# Altium schematic symbol library jlcpcb_2025_04_capacitors_extended_0805.schlib: 3281 symbols (part 5 of 18) (continued)
## 08055A180JAT2A
designator C?  Capacitance: 18pF  (hidden comment: *)
Capacitor, Ceramic (MLCC), 18pF, ±5%, 50V, C0G, ±5%, SMD 0805; Manufacturer: AVX; Manufacturer Part Number: 08055A180JAT2A; Package Size: 0805; JLCPCB Basic Part: No; JLCPCB Part Number: C597363; Supplier 1: LCSC; Category: Capacitors - MLCC; Supplier Part Number 1: C597363; Tolerance: ±5%; Voltage Rating: 50V; Temperature Coefficient: C0G; RoHS: Yes; ComponentLink1Description: Datasheet; ComponentLink1URL: https://wmsc.lcsc.com/wmsc/upload/file/pdf/v2/lcsc/2304140030_Kyocera-AVX-08055A180JAT2A_C597363.pdf; ComponentLink2Description: JLCPCB Part URL; ComponentLink2URL: https://jlcpcb.com/partdetail/C597363; ComponentLink3Description: LCSC Part URL; ComponentLink3URL: https://lcsc.com/product-detail/Multilayer-Ceramic-Capacitors-MLCC---SMD-SMT_Kyocera-AVX-Kyocera-AVX-08055A180JAT2A_C597363.html
footprint CAP-0805 (0805 (2012M) Capacitor)
pins: 1, 2

## 08055A200JAT2A
designator C?  Capacitance: 20pF  (hidden comment: *)
Capacitor, Ceramic (MLCC), 20pF, ±5%, 50V, C0G, ±5%, SMD 0805; Manufacturer: Kyocera AVX; Manufacturer Part Number: 08055A200JAT2A; Package Size: 0805; JLCPCB Basic Part: No; JLCPCB Part Number: C2169473; Supplier 1: LCSC; Category: Capacitors - MLCC; Supplier Part Number 1: C2169473; Tolerance: ±5%; Voltage Rating: 50V; Temperature Coefficient: C0G; RoHS: Yes; ComponentLink1Description: Datasheet; ComponentLink1URL: https://wmsc.lcsc.com/wmsc/upload/file/pdf/v2/lcsc/2304140030_Kyocera-AVX-08055A200JAT2A_C2169473.pdf; ComponentLink2Description: JLCPCB Part URL; ComponentLink2URL: https://jlcpcb.com/partdetail/C2169473; ComponentLink3Description: LCSC Part URL; ComponentLink3URL: https://lcsc.com/product-detail/Multilayer-Ceramic-Capacitors-MLCC---SMD-SMT_Kyocera-AVX-Kyocera-AVX-08055A200JAT2A_C2169473.html
footprint CAP-0805 (0805 (2012M) Capacitor)
pins: 1, 2

## 08055A220JAT2A
designator C?  Capacitance: 22pF  (hidden comment: *)
Capacitor, Ceramic (MLCC), 22pF, ±5%, 50V, C0G, ±5%, SMD 0805; Manufacturer: Kyocera AVX; Manufacturer Part Number: 08055A220JAT2A; Package Size: 0805; JLCPCB Basic Part: No; JLCPCB Part Number: C2167083; Supplier 1: LCSC; Category: Capacitors - MLCC; Supplier Part Number 1: C2167083; Tolerance: ±5%; Voltage Rating: 50V; Temperature Coefficient: C0G; RoHS: Yes; ComponentLink1Description: Datasheet; ComponentLink1URL: https://wmsc.lcsc.com/wmsc/upload/file/pdf/v2/lcsc/2304140030_Kyocera-AVX-08055A220JAT2A_C2167083.pdf; ComponentLink2Description: JLCPCB Part URL; ComponentLink2URL: https://jlcpcb.com/partdetail/C2167083; ComponentLink3Description: LCSC Part URL; ComponentLink3URL: https://lcsc.com/product-detail/Multilayer-Ceramic-Capacitors-MLCC---SMD-SMT_Kyocera-AVX-Kyocera-AVX-08055A220JAT2A_C2167083.html
footprint CAP-0805 (0805 (2012M) Capacitor)
pins: 1, 2

## 08055A220KAT2A
designator C?  Capacitance: 22pF  (hidden comment: *)
Capacitor, Ceramic (MLCC), 22pF, ±10%, 50V, C0G, ±10%, SMD 0805; Manufacturer: AVX; Manufacturer Part Number: 08055A220KAT2A; Package Size: 0805; JLCPCB Basic Part: No; JLCPCB Part Number: C597366; Supplier 1: LCSC; Category: Capacitors - MLCC; Supplier Part Number 1: C597366; Tolerance: ±10%; Voltage Rating: 50V; Temperature Coefficient: C0G; RoHS: Yes; ComponentLink1Description: Datasheet; ComponentLink1URL: https://wmsc.lcsc.com/wmsc/upload/file/pdf/v2/lcsc/2304140030_Kyocera-AVX-08055A220KAT2A_C597366.pdf; ComponentLink2Description: JLCPCB Part URL; ComponentLink2URL: https://jlcpcb.com/partdetail/C597366; ComponentLink3Description: LCSC Part URL; ComponentLink3URL: https://lcsc.com/product-detail/Multilayer-Ceramic-Capacitors-MLCC---SMD-SMT_Kyocera-AVX-Kyocera-AVX-08055A220KAT2A_C597366.html
footprint CAP-0805 (0805 (2012M) Capacitor)
pins: 1, 2

## 08055A221JAT2A
designator C?  Capacitance: 220pF  (hidden comment: *)
Capacitor, Ceramic (MLCC), 220pF, ±5%, 50V, C0G, ±5%, SMD 0805; Manufacturer: Kyocera AVX; Manufacturer Part Number: 08055A221JAT2A; Package Size: 0805; JLCPCB Basic Part: No; JLCPCB Part Number: C2169096; Supplier 1: LCSC; Category: Capacitors - MLCC; Supplier Part Number 1: C2169096; Tolerance: ±5%; Voltage Rating: 50V; Temperature Coefficient: C0G; RoHS: Yes; ComponentLink1Description: Datasheet; ComponentLink1URL: https://wmsc.lcsc.com/wmsc/upload/file/pdf/v2/lcsc/2304140030_Kyocera-AVX-08055A221JAT2A_C2169096.pdf; ComponentLink2Description: JLCPCB Part URL; ComponentLink2URL: https://jlcpcb.com/partdetail/C2169096; ComponentLink3Description: LCSC Part URL; ComponentLink3URL: https://lcsc.com/product-detail/Multilayer-Ceramic-Capacitors-MLCC---SMD-SMT_Kyocera-AVX-Kyocera-AVX-08055A221JAT2A_C2169096.html
footprint CAP-0805 (0805 (2012M) Capacitor)
pins: 1, 2

## 08055A222JAT2A
designator C?  Capacitance: 2.2nF  (hidden comment: *)
Capacitor, Ceramic (MLCC), 2.2nF, ±5%, 50V, C0G, ±5%, SMD 0805; Manufacturer: AVX; Manufacturer Part Number: 08055A222JAT2A; Package Size: 0805; JLCPCB Basic Part: No; JLCPCB Part Number: C597368; Supplier 1: LCSC; Category: Capacitors - MLCC; Supplier Part Number 1: C597368; Tolerance: ±5%; Voltage Rating: 50V; Temperature Coefficient: C0G; RoHS: Yes; ComponentLink1Description: Datasheet; ComponentLink1URL: https://wmsc.lcsc.com/wmsc/upload/file/pdf/v2/lcsc/2304140030_Kyocera-AVX-08055A222JAT2A_C597368.pdf; ComponentLink2Description: JLCPCB Part URL; ComponentLink2URL: https://jlcpcb.com/partdetail/C597368; ComponentLink3Description: LCSC Part URL; ComponentLink3URL: https://lcsc.com/product-detail/Multilayer-Ceramic-Capacitors-MLCC---SMD-SMT_Kyocera-AVX-Kyocera-AVX-08055A222JAT2A_C597368.html
footprint CAP-0805 (0805 (2012M) Capacitor)
pins: 1, 2

## 08055A271JAT2A
designator C?  Capacitance: 270pF  (hidden comment: *)
Capacitor, Ceramic (MLCC), 270pF, ±5%, 50V, C0G, ±5%, SMD 0805; Manufacturer: Kyocera AVX; Manufacturer Part Number: 08055A271JAT2A; Package Size: 0805; JLCPCB Basic Part: No; JLCPCB Part Number: C2180917; Supplier 1: LCSC; Category: Capacitors - MLCC; Supplier Part Number 1: C2180917; Tolerance: ±5%; Voltage Rating: 50V; Temperature Coefficient: C0G; RoHS: Yes; ComponentLink1Description: Datasheet; ComponentLink1URL: https://wmsc.lcsc.com/wmsc/upload/file/pdf/v2/lcsc/2304140030_Kyocera-AVX-08055A271JAT2A_C2180917.pdf; ComponentLink2Description: JLCPCB Part URL; ComponentLink2URL: https://jlcpcb.com/partdetail/C2180917; ComponentLink3Description: LCSC Part URL; ComponentLink3URL: https://lcsc.com/product-detail/Multilayer-Ceramic-Capacitors-MLCC---SMD-SMT_Kyocera-AVX-Kyocera-AVX-08055A271JAT2A_C2180917.html
footprint CAP-0805 (0805 (2012M) Capacitor)
pins: 1, 2

## 08055A391JAT2A
designator C?  Capacitance: 390pF  (hidden comment: *)
Capacitor, Ceramic (MLCC), 390pF, ±5%, 50V, C0G, ±5%, SMD 0805; Manufacturer: Kyocera AVX; Manufacturer Part Number: 08055A391JAT2A; Package Size: 0805; JLCPCB Basic Part: No; JLCPCB Part Number: C2176641; Supplier 1: LCSC; Category: Capacitors - MLCC; Supplier Part Number 1: C2176641; Tolerance: ±5%; Voltage Rating: 50V; Temperature Coefficient: C0G; RoHS: Yes; ComponentLink1Description: Datasheet; ComponentLink1URL: https://wmsc.lcsc.com/wmsc/upload/file/pdf/v2/lcsc/2304140030_Kyocera-AVX-08055A391JAT2A_C2176641.pdf; ComponentLink2Description: JLCPCB Part URL; ComponentLink2URL: https://jlcpcb.com/partdetail/C2176641; ComponentLink3Description: LCSC Part URL; ComponentLink3URL: https://lcsc.com/product-detail/Multilayer-Ceramic-Capacitors-MLCC---SMD-SMT_Kyocera-AVX-Kyocera-AVX-08055A391JAT2A_C2176641.html
footprint CAP-0805 (0805 (2012M) Capacitor)
pins: 1, 2

## 08055A470JAT2A
designator C?  Capacitance: 47pF  (hidden comment: *)
Capacitor, Ceramic (MLCC), 47pF, ±5%, 50V, C0G, ±5%, SMD 0805; Manufacturer: AVX; Manufacturer Part Number: 08055A470JAT2A; Package Size: 0805; JLCPCB Basic Part: No; JLCPCB Part Number: C597375; Supplier 1: LCSC; Category: Capacitors - MLCC; Supplier Part Number 1: C597375; Tolerance: ±5%; Voltage Rating: 50V; Temperature Coefficient: C0G; RoHS: Yes; ComponentLink1Description: Datasheet; ComponentLink1URL: https://wmsc.lcsc.com/wmsc/upload/file/pdf/v2/lcsc/2304140030_Kyocera-AVX-08055A470JAT2A_C597375.pdf; ComponentLink2Description: JLCPCB Part URL; ComponentLink2URL: https://jlcpcb.com/partdetail/C597375; ComponentLink3Description: LCSC Part URL; ComponentLink3URL: https://lcsc.com/product-detail/Multilayer-Ceramic-Capacitors-MLCC---SMD-SMT_Kyocera-AVX-Kyocera-AVX-08055A470JAT2A_C597375.html
footprint CAP-0805 (0805 (2012M) Capacitor)
pins: 1, 2

## 08055A680JAT2A
designator C?  Capacitance: 68pF  (hidden comment: *)
Capacitor, Ceramic (MLCC), 68pF, ±5%, 50V, C0G, ±5%, SMD 0805; Manufacturer: AVX; Manufacturer Part Number: 08055A680JAT2A; Package Size: 0805; JLCPCB Basic Part: No; JLCPCB Part Number: C597382; Supplier 1: LCSC; Category: Capacitors - MLCC; Supplier Part Number 1: C597382; Tolerance: ±5%; Voltage Rating: 50V; Temperature Coefficient: C0G; RoHS: Yes; ComponentLink1Description: Datasheet; ComponentLink1URL: https://wmsc.lcsc.com/wmsc/upload/file/pdf/v2/lcsc/2304140030_Kyocera-AVX-08055A680JAT2A_C597382.pdf; ComponentLink2Description: JLCPCB Part URL; ComponentLink2URL: https://jlcpcb.com/partdetail/C597382; ComponentLink3Description: LCSC Part URL; ComponentLink3URL: https://lcsc.com/product-detail/Multilayer-Ceramic-Capacitors-MLCC---SMD-SMT_Kyocera-AVX-Kyocera-AVX-08055A680JAT2A_C597382.html
footprint CAP-0805 (0805 (2012M) Capacitor)
pins: 1, 2

## 08055A681JAT2A
designator C?  Capacitance: 680pF  (hidden comment: *)
Capacitor, Ceramic (MLCC), 680pF, ±5%, 50V, C0G, ±5%, SMD 0805; Manufacturer: AVX; Manufacturer Part Number: 08055A681JAT2A; Package Size: 0805; JLCPCB Basic Part: No; JLCPCB Part Number: C597383; Supplier 1: LCSC; Category: Capacitors - MLCC; Supplier Part Number 1: C597383; Tolerance: ±5%; Voltage Rating: 50V; Temperature Coefficient: C0G; RoHS: Yes; ComponentLink1Description: Datasheet; ComponentLink1URL: https://wmsc.lcsc.com/wmsc/upload/file/pdf/v2/lcsc/2304140030_Kyocera-AVX-08055A681JAT2A_C597383.pdf; ComponentLink2Description: JLCPCB Part URL; ComponentLink2URL: https://jlcpcb.com/partdetail/C597383; ComponentLink3Description: LCSC Part URL; ComponentLink3URL: https://lcsc.com/product-detail/Multilayer-Ceramic-Capacitors-MLCC---SMD-SMT_Kyocera-AVX-Kyocera-AVX-08055A681JAT2A_C597383.html
footprint CAP-0805 (0805 (2012M) Capacitor)
pins: 1, 2

## 08055A820J4T2A
designator C?  Capacitance: 82pF  (hidden comment: *)
Capacitor, Ceramic (MLCC), 82pF, ±5%, 50V, C0G, ±5%, SMD 0805; Manufacturer: Kyocera AVX; Manufacturer Part Number: 08055A820J4T2A; Package Size: 0805; JLCPCB Basic Part: No; JLCPCB Part Number: C779987; Supplier 1: LCSC; Category: Capacitors - MLCC; Supplier Part Number 1: C779987; Tolerance: ±5%; Voltage Rating: 50V; Temperature Coefficient: C0G; RoHS: Yes; ComponentLink1Description: Datasheet; ComponentLink1URL: https://wmsc.lcsc.com/wmsc/upload/file/pdf/v2/lcsc/2304140030_Kyocera-AVX-08055A820J4T2A_C779987.pdf; ComponentLink2Description: JLCPCB Part URL; ComponentLink2URL: https://jlcpcb.com/partdetail/C779987; ComponentLink3Description: LCSC Part URL; ComponentLink3URL: https://lcsc.com/product-detail/Multilayer-Ceramic-Capacitors-MLCC---SMD-SMT_Kyocera-AVX-Kyocera-AVX-08055A820J4T2A_C779987.html
footprint CAP-0805 (0805 (2012M) Capacitor)
pins: 1, 2

## 08055C102JAT2A
designator C?  Capacitance: 1nF  (hidden comment: *)
Capacitor, Ceramic (MLCC), 1nF, ±5%, 50V, X7R, ±5%, SMD 0805; Manufacturer: Kyocera AVX; Manufacturer Part Number: 08055C102JAT2A; Package Size: 0805; JLCPCB Basic Part: No; JLCPCB Part Number: C2169203; Supplier 1: LCSC; Category: Capacitors - MLCC; Supplier Part Number 1: C2169203; Tolerance: ±5%; Voltage Rating: 50V; Temperature Coefficient: X7R; RoHS: Yes; ComponentLink1Description: Datasheet; ComponentLink1URL: https://wmsc.lcsc.com/wmsc/upload/file/pdf/v2/lcsc/2304140030_Kyocera-AVX-08055C102JAT2A_C2169203.pdf; ComponentLink2Description: JLCPCB Part URL; ComponentLink2URL: https://jlcpcb.com/partdetail/C2169203; ComponentLink3Description: LCSC Part URL; ComponentLink3URL: https://lcsc.com/product-detail/Multilayer-Ceramic-Capacitors-MLCC---SMD-SMT_Kyocera-AVX-Kyocera-AVX-08055C102JAT2A_C2169203.html
footprint CAP-0805 (0805 (2012M) Capacitor)
pins: 1, 2

## 08055C102KAT2A
designator C?  Capacitance: 1nF  (hidden comment: *)
Capacitor, Ceramic (MLCC), 1nF, ±10%, 50V, X7R, ±10%, SMD 0805; Manufacturer: Kyocera AVX; Manufacturer Part Number: 08055C102KAT2A; Package Size: 0805; JLCPCB Basic Part: No; JLCPCB Part Number: C2167121; Supplier 1: LCSC; Category: Capacitors - MLCC; Supplier Part Number 1: C2167121; Tolerance: ±10%; Voltage Rating: 50V; Temperature Coefficient: X7R; RoHS: Yes; ComponentLink1Description: Datasheet; ComponentLink1URL: https://wmsc.lcsc.com/wmsc/upload/file/pdf/v2/lcsc/2304140030_Kyocera-AVX-08055C102KAT2A_C2167121.pdf; ComponentLink2Description: JLCPCB Part URL; ComponentLink2URL: https://jlcpcb.com/partdetail/C2167121; ComponentLink3Description: LCSC Part URL; ComponentLink3URL: https://lcsc.com/product-detail/Multilayer-Ceramic-Capacitors-MLCC---SMD-SMT_Kyocera-AVX-Kyocera-AVX-08055C102KAT2A_C2167121.html
footprint CAP-0805 (0805 (2012M) Capacitor)
pins: 1, 2

## 08055C103JAT2A
designator C?  Capacitance: 10nF  (hidden comment: *)
Capacitor, Ceramic (MLCC), 10nF, ±5%, 50V, X7R, ±5%, SMD 0805; Manufacturer: AVX; Manufacturer Part Number: 08055C103JAT2A; Package Size: 0805; JLCPCB Basic Part: No; JLCPCB Part Number: C597391; Supplier 1: LCSC; Category: Capacitors - MLCC; Supplier Part Number 1: C597391; Tolerance: ±5%; Voltage Rating: 50V; Temperature Coefficient: X7R; RoHS: Yes; ComponentLink1Description: Datasheet; ComponentLink1URL: https://wmsc.lcsc.com/wmsc/upload/file/pdf/v2/lcsc/2304140030_Kyocera-AVX-08055C103JAT2A_C597391.pdf; ComponentLink2Description: JLCPCB Part URL; ComponentLink2URL: https://jlcpcb.com/partdetail/C597391; ComponentLink3Description: LCSC Part URL; ComponentLink3URL: https://lcsc.com/product-detail/Multilayer-Ceramic-Capacitors-MLCC---SMD-SMT_Kyocera-AVX-Kyocera-AVX-08055C103JAT2A_C597391.html
footprint CAP-0805 (0805 (2012M) Capacitor)
pins: 1, 2

## 08055C103K4T2A
designator C?  Capacitance: 10nF  (hidden comment: *)
Capacitor, Ceramic (MLCC), 10nF, ±10%, 50V, X7R, ±10%, SMD 0805; Manufacturer: AVX; Manufacturer Part Number: 08055C103K4T2A; Package Size: 0805; JLCPCB Basic Part: No; JLCPCB Part Number: C597392; Supplier 1: LCSC; Category: Capacitors - MLCC; Supplier Part Number 1: C597392; Tolerance: ±10%; Voltage Rating: 50V; Temperature Coefficient: X7R; RoHS: Yes; ComponentLink1Description: Datasheet; ComponentLink1URL: https://wmsc.lcsc.com/wmsc/upload/file/pdf/v2/lcsc/2304140030_Kyocera-AVX-08055C103K4T2A_C597392.pdf; ComponentLink2Description: JLCPCB Part URL; ComponentLink2URL: https://jlcpcb.com/partdetail/C597392; ComponentLink3Description: LCSC Part URL; ComponentLink3URL: https://lcsc.com/product-detail/Multilayer-Ceramic-Capacitors-MLCC---SMD-SMT_Kyocera-AVX-Kyocera-AVX-08055C103K4T2A_C597392.html
footprint CAP-0805 (0805 (2012M) Capacitor)
pins: 1, 2

## 08055C103KAT2A
designator C?  Capacitance: 10nF  (hidden comment: *)
Capacitor, Ceramic (MLCC), 10nF, ±10%, 50V, X7R, ±10%, SMD 0805; Manufacturer: AVX; Manufacturer Part Number: 08055C103KAT2A; Package Size: 0805; JLCPCB Basic Part: No; JLCPCB Part Number: C128911; Supplier 1: LCSC; Category: Capacitors - MLCC; Supplier Part Number 1: C128911; Tolerance: ±10%; Voltage Rating: 50V; Temperature Coefficient: X7R; RoHS: Yes; ComponentLink1Description: Datasheet; ComponentLink1URL: https://wmsc.lcsc.com/wmsc/upload/file/pdf/v2/lcsc/2304140030_Kyocera-AVX-08055C103KAT2A_C128911.pdf; ComponentLink2Description: JLCPCB Part URL; ComponentLink2URL: https://jlcpcb.com/partdetail/C128911; ComponentLink3Description: LCSC Part URL; ComponentLink3URL: https://lcsc.com/product-detail/Multilayer-Ceramic-Capacitors-MLCC---SMD-SMT_Kyocera-AVX-Kyocera-AVX-08055C103KAT2A_C128911.html
footprint CAP-0805 (0805 (2012M) Capacitor)
pins: 1, 2

## 08055C103KAT4A
designator C?  Capacitance: 10nF  (hidden comment: *)
Capacitor, Ceramic (MLCC), 10nF, ±10%, 50V, X7R, ±10%, SMD 0805; Manufacturer: Kyocera AVX; Manufacturer Part Number: 08055C103KAT4A; Package Size: 0805; JLCPCB Basic Part: No; JLCPCB Part Number: C2168664; Supplier 1: LCSC; Category: Capacitors - MLCC; Supplier Part Number 1: C2168664; Tolerance: ±10%; Voltage Rating: 50V; Temperature Coefficient: X7R; RoHS: Yes; ComponentLink1Description: Datasheet; ComponentLink1URL: https://wmsc.lcsc.com/wmsc/upload/file/pdf/v2/lcsc/2304140030_Kyocera-AVX-08055C103KAT4A_C2168664.pdf; ComponentLink2Description: JLCPCB Part URL; ComponentLink2URL: https://jlcpcb.com/partdetail/C2168664; ComponentLink3Description: LCSC Part URL; ComponentLink3URL: https://lcsc.com/product-detail/Multilayer-Ceramic-Capacitors-MLCC---SMD-SMT_Kyocera-AVX-Kyocera-AVX-08055C103KAT4A_C2168664.html
footprint CAP-0805 (0805 (2012M) Capacitor)
pins: 1, 2

## 08055C103MAT2A
designator C?  Capacitance: 10nF  (hidden comment: *)
Capacitor, Ceramic (MLCC), 10nF, ±20%, 50V, X7R, ±20%, SMD 0805; Manufacturer: Kyocera AVX; Manufacturer Part Number: 08055C103MAT2A; Package Size: 0805; JLCPCB Basic Part: No; JLCPCB Part Number: C2180057; Supplier 1: LCSC; Category: Capacitors - MLCC; Supplier Part Number 1: C2180057; Tolerance: ±20%; Voltage Rating: 50V; Temperature Coefficient: X7R; RoHS: Yes; ComponentLink1Description: Datasheet; ComponentLink1URL: https://wmsc.lcsc.com/wmsc/upload/file/pdf/v2/lcsc/2304140030_Kyocera-AVX-08055C103MAT2A_C2180057.pdf; ComponentLink2Description: JLCPCB Part URL; ComponentLink2URL: https://jlcpcb.com/partdetail/C2180057; ComponentLink3Description: LCSC Part URL; ComponentLink3URL: https://lcsc.com/product-detail/Multilayer-Ceramic-Capacitors-MLCC---SMD-SMT_Kyocera-AVX-Kyocera-AVX-08055C103MAT2A_C2180057.html
footprint CAP-0805 (0805 (2012M) Capacitor)
pins: 1, 2

## 08055C104K4T2A
designator C?  Capacitance: 100nF  (hidden comment: *)
Capacitor, Ceramic (MLCC), 100nF, ±10%, 50V, X7R, ±10%, SMD 0805; Manufacturer: Kyocera AVX; Manufacturer Part Number: 08055C104K4T2A; Package Size: 0805; JLCPCB Basic Part: No; JLCPCB Part Number: C779975; Supplier 1: LCSC; Category: Capacitors - MLCC; Supplier Part Number 1: C779975; Tolerance: ±10%; Voltage Rating: 50V; Temperature Coefficient: X7R; RoHS: Yes; ComponentLink1Description: Datasheet; ComponentLink1URL: https://wmsc.lcsc.com/wmsc/upload/file/pdf/v2/lcsc/2304140030_Kyocera-AVX-08055C104K4T2A_C779975.pdf; ComponentLink2Description: JLCPCB Part URL; ComponentLink2URL: https://jlcpcb.com/partdetail/C779975; ComponentLink3Description: LCSC Part URL; ComponentLink3URL: https://lcsc.com/product-detail/Multilayer-Ceramic-Capacitors-MLCC---SMD-SMT_Kyocera-AVX-Kyocera-AVX-08055C104K4T2A_C779975.html
footprint CAP-0805 (0805 (2012M) Capacitor)
pins: 1, 2

## 08055C104K4Z2A
designator C?  Capacitance: 100nF  (hidden comment: *)
Capacitor, Ceramic (MLCC), 100nF, ±10%, 50V, X7R, ±10%, SMD 0805; Manufacturer: Kyocera AVX; Manufacturer Part Number: 08055C104K4Z2A; Package Size: 0805; JLCPCB Basic Part: No; JLCPCB Part Number: C779984; Supplier 1: LCSC; Category: Capacitors - MLCC; Supplier Part Number 1: C779984; Tolerance: ±10%; Voltage Rating: 50V; Temperature Coefficient: X7R; RoHS: Yes; ComponentLink1Description: Datasheet; ComponentLink1URL: https://wmsc.lcsc.com/wmsc/upload/file/pdf/v2/lcsc/2304140030_Kyocera-AVX-08055C104K4Z2A_C779984.pdf; ComponentLink2Description: JLCPCB Part URL; ComponentLink2URL: https://jlcpcb.com/partdetail/C779984; ComponentLink3Description: LCSC Part URL; ComponentLink3URL: https://lcsc.com/product-detail/Multilayer-Ceramic-Capacitors-MLCC---SMD-SMT_Kyocera-AVX-Kyocera-AVX-08055C104K4Z2A_C779984.html
footprint CAP-0805 (0805 (2012M) Capacitor)
pins: 1, 2

## 08055C104KAT4A
designator C?  Capacitance: 100nF  (hidden comment: *)
Capacitor, Ceramic (MLCC), 100nF, ±10%, 50V, X7R, ±10%, SMD 0805; Manufacturer: Kyocera AVX; Manufacturer Part Number: 08055C104KAT4A; Package Size: 0805; JLCPCB Basic Part: No; JLCPCB Part Number: C2167422; Supplier 1: LCSC; Category: Capacitors - MLCC; Supplier Part Number 1: C2167422; Tolerance: ±10%; Voltage Rating: 50V; Temperature Coefficient: X7R; RoHS: Yes; ComponentLink1Description: Datasheet; ComponentLink1URL: https://wmsc.lcsc.com/wmsc/upload/file/pdf/v2/lcsc/2304140030_Kyocera-AVX-08055C104KAT4A_C2167422.pdf; ComponentLink2Description: JLCPCB Part URL; ComponentLink2URL: https://jlcpcb.com/partdetail/C2167422; ComponentLink3Description: LCSC Part URL; ComponentLink3URL: https://lcsc.com/product-detail/Multilayer-Ceramic-Capacitors-MLCC---SMD-SMT_Kyocera-AVX-Kyocera-AVX-08055C104KAT4A_C2167422.html
footprint CAP-0805 (0805 (2012M) Capacitor)
pins: 1, 2

## 08055C104KAZ2A
designator C?  Capacitance: 0.1uF  (hidden comment: *)
Capacitor, Ceramic (MLCC), 0.1uF, ±10%, 50V, X7R, ±10%, SMD 0805; Manufacturer: Kyocera AVX; Manufacturer Part Number: 08055C104KAZ2A; Package Size: 0805; JLCPCB Basic Part: No; JLCPCB Part Number: C6641151; Supplier 1: LCSC; Category: Capacitors - MLCC; Supplier Part Number 1: C6641151; Tolerance: ±10%; Voltage Rating: 50V; Temperature Coefficient: X7R; RoHS: Yes; ComponentLink1Description: Datasheet; ComponentLink1URL: https://wmsc.lcsc.com/wmsc/upload/file/pdf/v2/lcsc/2309150940_Kyocera-AVX-08055C104KAZ2A_C6641151.pdf; ComponentLink2Description: JLCPCB Part URL; ComponentLink2URL: https://jlcpcb.com/partdetail/C6641151; ComponentLink3Description: LCSC Part URL; ComponentLink3URL: https://lcsc.com/product-detail/Multilayer-Ceramic-Capacitors-MLCC---SMD-SMT_Kyocera-AVX-Kyocera-AVX-08055C104KAZ2A_C6641151.html
footprint CAP-0805 (0805 (2012M) Capacitor)
pins: 1, 2

## 08055C105K4Z2A
designator C?  Capacitance: 1uF  (hidden comment: *)
Capacitor, Ceramic (MLCC), 1uF, ±10%, 50V, X7R, ±10%, SMD 0805; Manufacturer: Kyocera AVX; Manufacturer Part Number: 08055C105K4Z2A; Package Size: 0805; JLCPCB Basic Part: No; JLCPCB Part Number: C2168045; Supplier 1: LCSC; Category: Capacitors - MLCC; Supplier Part Number 1: C2168045; Tolerance: ±10%; Voltage Rating: 50V; Temperature Coefficient: X7R; RoHS: Yes; ComponentLink1Description: Datasheet; ComponentLink1URL: https://wmsc.lcsc.com/wmsc/upload/file/pdf/v2/lcsc/2304140030_Kyocera-AVX-08055C105K4Z2A_C2168045.pdf; ComponentLink2Description: JLCPCB Part URL; ComponentLink2URL: https://jlcpcb.com/partdetail/C2168045; ComponentLink3Description: LCSC Part URL; ComponentLink3URL: https://lcsc.com/product-detail/Multilayer-Ceramic-Capacitors-MLCC---SMD-SMT_Kyocera-AVX-Kyocera-AVX-08055C105K4Z2A_C2168045.html
footprint CAP-0805 (0805 (2012M) Capacitor)
pins: 1, 2

## 08055C105KAT2A
designator C?  Capacitance: 1uF  (hidden comment: *)
Capacitor, Ceramic (MLCC), 1uF, ±10%, 50V, X7R, ±10%, SMD 0805; Manufacturer: AVX; Manufacturer Part Number: 08055C105KAT2A; Package Size: 0805; JLCPCB Basic Part: No; JLCPCB Part Number: C2167382; Supplier 1: LCSC; Category: Capacitors - MLCC; Supplier Part Number 1: C2167382; Tolerance: ±10%; Voltage Rating: 50V; Temperature Coefficient: X7R; RoHS: Yes; ComponentLink1Description: Datasheet; ComponentLink1URL: https://wmsc.lcsc.com/wmsc/upload/file/pdf/v2/lcsc/2304140030_Kyocera-AVX-08055C105KAT2A_C2167382.pdf; ComponentLink2Description: JLCPCB Part URL; ComponentLink2URL: https://jlcpcb.com/partdetail/C2167382; ComponentLink3Description: LCSC Part URL; ComponentLink3URL: https://lcsc.com/product-detail/Multilayer-Ceramic-Capacitors-MLCC---SMD-SMT_Kyocera-AVX-Kyocera-AVX-08055C105KAT2A_C2167382.html
footprint CAP-0805 (0805 (2012M) Capacitor)
pins: 1, 2

## 08055C153KAT2A
designator C?  Capacitance: 15nF  (hidden comment: *)
Capacitor, Ceramic (MLCC), 15nF, ±10%, 50V, X7R, ±10%, SMD 0805; Manufacturer: AVX; Manufacturer Part Number: 08055C153KAT2A; Package Size: 0805; JLCPCB Basic Part: No; JLCPCB Part Number: C597399; Supplier 1: LCSC; Category: Capacitors - MLCC; Supplier Part Number 1: C597399; Tolerance: ±10%; Voltage Rating: 50V; Temperature Coefficient: X7R; RoHS: Yes; ComponentLink1Description: Datasheet; ComponentLink1URL: https://wmsc.lcsc.com/wmsc/upload/file/pdf/v2/lcsc/2304140030_Kyocera-AVX-08055C153KAT2A_C597399.pdf; ComponentLink2Description: JLCPCB Part URL; ComponentLink2URL: https://jlcpcb.com/partdetail/C597399; ComponentLink3Description: LCSC Part URL; ComponentLink3URL: https://lcsc.com/product-detail/Multilayer-Ceramic-Capacitors-MLCC---SMD-SMT_Kyocera-AVX-Kyocera-AVX-08055C153KAT2A_C597399.html
footprint CAP-0805 (0805 (2012M) Capacitor)
pins: 1, 2

## 08055C221KAT2A
designator C?  Capacitance: 220pF  (hidden comment: *)
Capacitor, Ceramic (MLCC), 220pF, ±10%, 50V, X7R, ±10%, SMD 0805; Manufacturer: AVX; Manufacturer Part Number: 08055C221KAT2A; Package Size: 0805; JLCPCB Basic Part: No; JLCPCB Part Number: C597402; Supplier 1: LCSC; Category: Capacitors - MLCC; Supplier Part Number 1: C597402; Tolerance: ±10%; Voltage Rating: 50V; Temperature Coefficient: X7R; RoHS: Yes; ComponentLink1Description: Datasheet; ComponentLink1URL: https://wmsc.lcsc.com/wmsc/upload/file/pdf/v2/lcsc/2304140030_Kyocera-AVX-08055C221KAT2A_C597402.pdf; ComponentLink2Description: JLCPCB Part URL; ComponentLink2URL: https://jlcpcb.com/partdetail/C597402; ComponentLink3Description: LCSC Part URL; ComponentLink3URL: https://lcsc.com/product-detail/Multilayer-Ceramic-Capacitors-MLCC---SMD-SMT_Kyocera-AVX-Kyocera-AVX-08055C221KAT2A_C597402.html
footprint CAP-0805 (0805 (2012M) Capacitor)
pins: 1, 2

## 08055C223KAT2A
designator C?  Capacitance: 22nF  (hidden comment: *)
Capacitor, Ceramic (MLCC), 22nF, ±10%, 50V, X7R, ±10%, SMD 0805; Manufacturer: Kyocera AVX; Manufacturer Part Number: 08055C223KAT2A; Package Size: 0805; JLCPCB Basic Part: No; JLCPCB Part Number: C2167310; Supplier 1: LCSC; Category: Capacitors - MLCC; Supplier Part Number 1: C2167310; Tolerance: ±10%; Voltage Rating: 50V; Temperature Coefficient: X7R; RoHS: Yes; ComponentLink1Description: Datasheet; ComponentLink1URL: https://wmsc.lcsc.com/wmsc/upload/file/pdf/v2/lcsc/2304140030_Kyocera-AVX-08055C223KAT2A_C2167310.pdf; ComponentLink2Description: JLCPCB Part URL; ComponentLink2URL: https://jlcpcb.com/partdetail/C2167310; ComponentLink3Description: LCSC Part URL; ComponentLink3URL: https://lcsc.com/product-detail/Multilayer-Ceramic-Capacitors-MLCC---SMD-SMT_Kyocera-AVX-Kyocera-AVX-08055C223KAT2A_C2167310.html
footprint CAP-0805 (0805 (2012M) Capacitor)
pins: 1, 2

## 08055C224JAT2A
designator C?  Capacitance: 220nF  (hidden comment: *)
Capacitor, Ceramic (MLCC), 220nF, ±5%, 50V, X7R, ±5%, SMD 0805; Manufacturer: Kyocera AVX; Manufacturer Part Number: 08055C224JAT2A; Package Size: 0805; JLCPCB Basic Part: No; JLCPCB Part Number: C2167607; Supplier 1: LCSC; Category: Capacitors - MLCC; Supplier Part Number 1: C2167607; Tolerance: ±5%; Voltage Rating: 50V; Temperature Coefficient: X7R; RoHS: Yes; ComponentLink1Description: Datasheet; ComponentLink1URL: https://wmsc.lcsc.com/wmsc/upload/file/pdf/v2/lcsc/2304140030_Kyocera-AVX-08055C224JAT2A_C2167607.pdf; ComponentLink2Description: JLCPCB Part URL; ComponentLink2URL: https://jlcpcb.com/partdetail/C2167607; ComponentLink3Description: LCSC Part URL; ComponentLink3URL: https://lcsc.com/product-detail/Multilayer-Ceramic-Capacitors-MLCC---SMD-SMT_Kyocera-AVX-Kyocera-AVX-08055C224JAT2A_C2167607.html
footprint CAP-0805 (0805 (2012M) Capacitor)
pins: 1, 2

## 08055C333KAT2A
designator C?  Capacitance: 33nF  (hidden comment: *)
Capacitor, Ceramic (MLCC), 33nF, ±10%, 50V, X7R, ±10%, SMD 0805; Manufacturer: Kyocera AVX; Manufacturer Part Number: 08055C333KAT2A; Package Size: 0805; JLCPCB Basic Part: No; JLCPCB Part Number: C2169742; Supplier 1: LCSC; Category: Capacitors - MLCC; Supplier Part Number 1: C2169742; Tolerance: ±10%; Voltage Rating: 50V; Temperature Coefficient: X7R; RoHS: Yes; ComponentLink1Description: Datasheet; ComponentLink1URL: https://wmsc.lcsc.com/wmsc/upload/file/pdf/v2/lcsc/2304140030_Kyocera-AVX-08055C333KAT2A_C2169742.pdf; ComponentLink2Description: JLCPCB Part URL; ComponentLink2URL: https://jlcpcb.com/partdetail/C2169742; ComponentLink3Description: LCSC Part URL; ComponentLink3URL: https://lcsc.com/product-detail/Multilayer-Ceramic-Capacitors-MLCC---SMD-SMT_Kyocera-AVX-Kyocera-AVX-08055C333KAT2A_C2169742.html
footprint CAP-0805 (0805 (2012M) Capacitor)
pins: 1, 2

## 08055C334K4T2A
designator C?  Capacitance: 330nF  (hidden comment: *)
Capacitor, Ceramic (MLCC), 330nF, ±10%, 50V, X7R, ±10%, SMD 0805; Manufacturer: Kyocera AVX; Manufacturer Part Number: 08055C334K4T2A; Package Size: 0805; JLCPCB Basic Part: No; JLCPCB Part Number: C2170933; Supplier 1: LCSC; Category: Capacitors - MLCC; Supplier Part Number 1: C2170933; Tolerance: ±10%; Voltage Rating: 50V; Temperature Coefficient: X7R; RoHS: Yes; ComponentLink1Description: Datasheet; ComponentLink1URL: https://wmsc.lcsc.com/wmsc/upload/file/pdf/v2/lcsc/2304140030_Kyocera-AVX-08055C334K4T2A_C2170933.pdf; ComponentLink2Description: JLCPCB Part URL; ComponentLink2URL: https://jlcpcb.com/partdetail/C2170933; ComponentLink3Description: LCSC Part URL; ComponentLink3URL: https://lcsc.com/product-detail/Multilayer-Ceramic-Capacitors-MLCC---SMD-SMT_Kyocera-AVX-Kyocera-AVX-08055C334K4T2A_C2170933.html
footprint CAP-0805 (0805 (2012M) Capacitor)
pins: 1, 2

## 08055C334K4Z2A
designator C?  Capacitance: 330nF  (hidden comment: *)
Capacitor, Ceramic (MLCC), 330nF, ±10%, 50V, X7R, ±10%, SMD 0805; Manufacturer: AVX; Manufacturer Part Number: 08055C334K4Z2A; Package Size: 0805; JLCPCB Basic Part: No; JLCPCB Part Number: C597413; Supplier 1: LCSC; Category: Capacitors - MLCC; Supplier Part Number 1: C597413; Tolerance: ±10%; Voltage Rating: 50V; Temperature Coefficient: X7R; RoHS: Yes; ComponentLink1Description: Datasheet; ComponentLink1URL: https://wmsc.lcsc.com/wmsc/upload/file/pdf/v2/lcsc/2304140030_Kyocera-AVX-08055C334K4Z2A_C597413.pdf; ComponentLink2Description: JLCPCB Part URL; ComponentLink2URL: https://jlcpcb.com/partdetail/C597413; ComponentLink3Description: LCSC Part URL; ComponentLink3URL: https://lcsc.com/product-detail/Multilayer-Ceramic-Capacitors-MLCC---SMD-SMT_Kyocera-AVX-Kyocera-AVX-08055C334K4Z2A_C597413.html
footprint CAP-0805 (0805 (2012M) Capacitor)
pins: 1, 2

## 08055C334KAT2A
designator C?  Capacitance: 330nF  (hidden comment: *)
Capacitor, Ceramic (MLCC), 330nF, ±10%, 50V, X7R, ±10%, SMD 0805; Manufacturer: AVX; Manufacturer Part Number: 08055C334KAT2A; Package Size: 0805; JLCPCB Basic Part: No; JLCPCB Part Number: C597414; Supplier 1: LCSC; Category: Capacitors - MLCC; Supplier Part Number 1: C597414; Tolerance: ±10%; Voltage Rating: 50V; Temperature Coefficient: X7R; RoHS: Yes; ComponentLink1Description: Datasheet; ComponentLink1URL: https://wmsc.lcsc.com/wmsc/upload/file/pdf/v2/lcsc/2304140030_Kyocera-AVX-08055C334KAT2A_C597414.pdf; ComponentLink2Description: JLCPCB Part URL; ComponentLink2URL: https://jlcpcb.com/partdetail/C597414; ComponentLink3Description: LCSC Part URL; ComponentLink3URL: https://lcsc.com/product-detail/Multilayer-Ceramic-Capacitors-MLCC---SMD-SMT_Kyocera-AVX-Kyocera-AVX-08055C334KAT2A_C597414.html
footprint CAP-0805 (0805 (2012M) Capacitor)
pins: 1, 2

## 08055C472JAT2A
designator C?  Capacitance: 4.7nF  (hidden comment: *)
Capacitor, Ceramic (MLCC), 4.7nF, ±5%, 50V, X7R, ±5%, SMD 0805; Manufacturer: AVX; Manufacturer Part Number: 08055C472JAT2A; Package Size: 0805; JLCPCB Basic Part: No; JLCPCB Part Number: C597415; Supplier 1: LCSC; Category: Capacitors - MLCC; Supplier Part Number 1: C597415; Tolerance: ±5%; Voltage Rating: 50V; Temperature Coefficient: X7R; RoHS: Yes; ComponentLink1Description: Datasheet; ComponentLink1URL: https://wmsc.lcsc.com/wmsc/upload/file/pdf/v2/lcsc/2304140030_Kyocera-AVX-08055C472JAT2A_C597415.pdf; ComponentLink2Description: JLCPCB Part URL; ComponentLink2URL: https://jlcpcb.com/partdetail/C597415; ComponentLink3Description: LCSC Part URL; ComponentLink3URL: https://lcsc.com/product-detail/Multilayer-Ceramic-Capacitors-MLCC---SMD-SMT_Kyocera-AVX-Kyocera-AVX-08055C472JAT2A_C597415.html
footprint CAP-0805 (0805 (2012M) Capacitor)
pins: 1, 2

## 08055C472KAT2A
designator C?  Capacitance: 4.7nF  (hidden comment: *)
Capacitor, Ceramic (MLCC), 4.7nF, ±10%, 50V, X7R, ±10%, SMD 0805; Manufacturer: AVX; Manufacturer Part Number: 08055C472KAT2A; Package Size: 0805; JLCPCB Basic Part: No; JLCPCB Part Number: C597416; Supplier 1: LCSC; Category: Capacitors - MLCC; Supplier Part Number 1: C597416; Tolerance: ±10%; Voltage Rating: 50V; Temperature Coefficient: X7R; RoHS: Yes; ComponentLink1Description: Datasheet; ComponentLink1URL: https://wmsc.lcsc.com/wmsc/upload/file/pdf/v2/lcsc/2304140030_Kyocera-AVX-08055C472KAT2A_C597416.pdf; ComponentLink2Description: JLCPCB Part URL; ComponentLink2URL: https://jlcpcb.com/partdetail/C597416; ComponentLink3Description: LCSC Part URL; ComponentLink3URL: https://lcsc.com/product-detail/Multilayer-Ceramic-Capacitors-MLCC---SMD-SMT_Kyocera-AVX-Kyocera-AVX-08055C472KAT2A_C597416.html
footprint CAP-0805 (0805 (2012M) Capacitor)
pins: 1, 2

## 08055C473K4Z2A
designator C?  Capacitance: 47nF  (hidden comment: *)
Capacitor, Ceramic (MLCC), 47nF, ±10%, 50V, X7R, ±10%, SMD 0805; Manufacturer: AVX; Manufacturer Part Number: 08055C473K4Z2A; Package Size: 0805; JLCPCB Basic Part: No; JLCPCB Part Number: C597420; Supplier 1: LCSC; Category: Capacitors - MLCC; Supplier Part Number 1: C597420; Tolerance: ±10%; Voltage Rating: 50V; Temperature Coefficient: X7R; RoHS: Yes; ComponentLink1Description: Datasheet; ComponentLink1URL: https://wmsc.lcsc.com/wmsc/upload/file/pdf/v2/lcsc/2304140030_Kyocera-AVX-08055C473K4Z2A_C597420.pdf; ComponentLink2Description: JLCPCB Part URL; ComponentLink2URL: https://jlcpcb.com/partdetail/C597420; ComponentLink3Description: LCSC Part URL; ComponentLink3URL: https://lcsc.com/product-detail/Multilayer-Ceramic-Capacitors-MLCC---SMD-SMT_Kyocera-AVX-Kyocera-AVX-08055C473K4Z2A_C597420.html
footprint CAP-0805 (0805 (2012M) Capacitor)
pins: 1, 2

## 08055C474JAT2A
designator C?  Capacitance: 470nF  (hidden comment: *)
Capacitor, Ceramic (MLCC), 470nF, ±5%, 50V, X7R, ±5%, SMD 0805; Manufacturer: Kyocera AVX; Manufacturer Part Number: 08055C474JAT2A; Package Size: 0805; JLCPCB Basic Part: No; JLCPCB Part Number: C2170914; Supplier 1: LCSC; Category: Capacitors - MLCC; Supplier Part Number 1: C2170914; Tolerance: ±5%; Voltage Rating: 50V; Temperature Coefficient: X7R; RoHS: Yes; ComponentLink1Description: Datasheet; ComponentLink1URL: https://wmsc.lcsc.com/wmsc/upload/file/pdf/v2/lcsc/2304140030_Kyocera-AVX-08055C474JAT2A_C2170914.pdf; ComponentLink2Description: JLCPCB Part URL; ComponentLink2URL: https://jlcpcb.com/partdetail/C2170914; ComponentLink3Description: LCSC Part URL; ComponentLink3URL: https://lcsc.com/product-detail/Multilayer-Ceramic-Capacitors-MLCC---SMD-SMT_Kyocera-AVX-Kyocera-AVX-08055C474JAT2A_C2170914.html
footprint CAP-0805 (0805 (2012M) Capacitor)
pins: 1, 2

## 08055C474K4T2A
designator C?  Capacitance: 470nF  (hidden comment: *)
Capacitor, Ceramic (MLCC), 470nF, ±10%, 50V, X7R, ±10%, SMD 0805; Manufacturer: Kyocera AVX; Manufacturer Part Number: 08055C474K4T2A; Package Size: 0805; JLCPCB Basic Part: No; JLCPCB Part Number: C779990; Supplier 1: LCSC; Category: Capacitors - MLCC; Supplier Part Number 1: C779990; Tolerance: ±10%; Voltage Rating: 50V; Temperature Coefficient: X7R; RoHS: Yes; ComponentLink1Description: Datasheet; ComponentLink1URL: https://wmsc.lcsc.com/wmsc/upload/file/pdf/v2/lcsc/2304140030_Kyocera-AVX-08055C474K4T2A_C779990.pdf; ComponentLink2Description: JLCPCB Part URL; ComponentLink2URL: https://jlcpcb.com/partdetail/C779990; ComponentLink3Description: LCSC Part URL; ComponentLink3URL: https://lcsc.com/product-detail/Multilayer-Ceramic-Capacitors-MLCC---SMD-SMT_Kyocera-AVX-Kyocera-AVX-08055C474K4T2A_C779990.html
footprint CAP-0805 (0805 (2012M) Capacitor)
pins: 1, 2

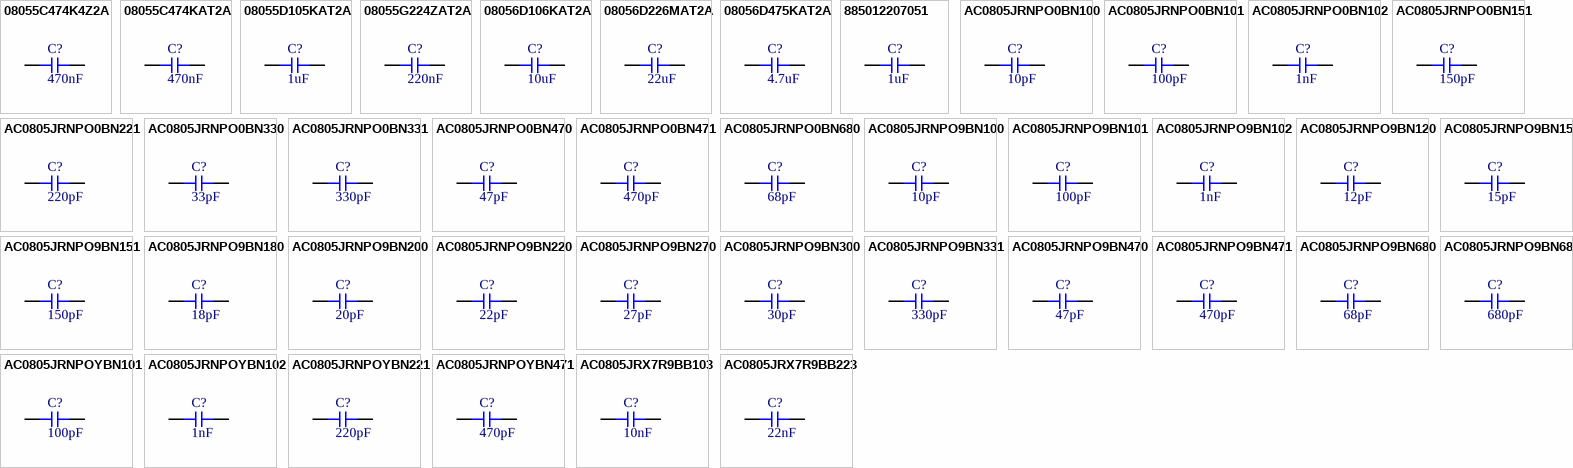
[diagram p20: symbols 08055C474K4Z2A to AC0805JRX7R9BB223]

## 08055C474K4Z2A
designator C?  Capacitance: 470nF  (hidden comment: *)
Capacitor, Ceramic (MLCC), 470nF, ±10%, 50V, X7R, ±10%, SMD 0805; Manufacturer: Kyocera AVX; Manufacturer Part Number: 08055C474K4Z2A; Package Size: 0805; JLCPCB Basic Part: No; JLCPCB Part Number: C779993; Supplier 1: LCSC; Category: Capacitors - MLCC; Supplier Part Number 1: C779993; Tolerance: ±10%; Voltage Rating: 50V; Temperature Coefficient: X7R; RoHS: Yes; ComponentLink1Description: Datasheet; ComponentLink1URL: https://wmsc.lcsc.com/wmsc/upload/file/pdf/v2/lcsc/2304140030_Kyocera-AVX-08055C474K4Z2A_C779993.pdf; ComponentLink2Description: JLCPCB Part URL; ComponentLink2URL: https://jlcpcb.com/partdetail/C779993; ComponentLink3Description: LCSC Part URL; ComponentLink3URL: https://lcsc.com/product-detail/Multilayer-Ceramic-Capacitors-MLCC---SMD-SMT_Kyocera-AVX-Kyocera-AVX-08055C474K4Z2A_C779993.html
footprint CAP-0805 (0805 (2012M) Capacitor)
pins: 1, 2

## 08055C474KAT2A
designator C?  Capacitance: 470nF  (hidden comment: *)
Capacitor, Ceramic (MLCC), 470nF, ±10%, 50V, X7R, ±10%, SMD 0805; Manufacturer: Kyocera AVX; Manufacturer Part Number: 08055C474KAT2A; Package Size: 0805; JLCPCB Basic Part: No; JLCPCB Part Number: C4153102; Supplier 1: LCSC; Category: Capacitors - MLCC; Supplier Part Number 1: C4153102; Tolerance: ±10%; Voltage Rating: 50V; Temperature Coefficient: X7R; RoHS: Yes; ComponentLink1Description: Datasheet; ComponentLink1URL: https://wmsc.lcsc.com/wmsc/upload/file/pdf/v2/lcsc/2207111801_Kyocera-AVX-08055C474KAT2A_C4153102.pdf; ComponentLink2Description: JLCPCB Part URL; ComponentLink2URL: https://jlcpcb.com/partdetail/C4153102; ComponentLink3Description: LCSC Part URL; ComponentLink3URL: https://lcsc.com/product-detail/Multilayer-Ceramic-Capacitors-MLCC---SMD-SMT_Kyocera-AVX-Kyocera-AVX-08055C474KAT2A_C4153102.html
footprint CAP-0805 (0805 (2012M) Capacitor)
pins: 1, 2

## 08055D105KAT2A
designator C?  Capacitance: 1uF  (hidden comment: *)
Capacitor, Ceramic (MLCC), 1uF, ±10%, 50V, X5R, ±10%, SMD 0805; Manufacturer: Kyocera AVX; Manufacturer Part Number: 08055D105KAT2A; Package Size: 0805; JLCPCB Basic Part: No; JLCPCB Part Number: C2167586; Supplier 1: LCSC; Category: Capacitors - MLCC; Supplier Part Number 1: C2167586; Tolerance: ±10%; Voltage Rating: 50V; Temperature Coefficient: X5R; RoHS: Yes; ComponentLink1Description: Datasheet; ComponentLink1URL: https://wmsc.lcsc.com/wmsc/upload/file/pdf/v2/lcsc/2304140030_Kyocera-AVX-08055D105KAT2A_C2167586.pdf; ComponentLink2Description: JLCPCB Part URL; ComponentLink2URL: https://jlcpcb.com/partdetail/C2167586; ComponentLink3Description: LCSC Part URL; ComponentLink3URL: https://lcsc.com/product-detail/Multilayer-Ceramic-Capacitors-MLCC---SMD-SMT_Kyocera-AVX-Kyocera-AVX-08055D105KAT2A_C2167586.html
footprint CAP-0805 (0805 (2012M) Capacitor)
pins: 1, 2

## 08055G224ZAT2A
designator C?  Capacitance: 220nF  (hidden comment: *)
Capacitor, Ceramic (MLCC), 220nF, 50V, Y5V, SMD 0805; Manufacturer: Kyocera AVX; Manufacturer Part Number: 08055G224ZAT2A; Temperature Rating: -20%~+80%; Package Size: 0805; JLCPCB Basic Part: No; JLCPCB Part Number: C2760773; Supplier 1: LCSC; Category: Capacitors - MLCC; Supplier Part Number 1: C2760773; Voltage Rating: 50V; Temperature Coefficient: Y5V; RoHS: Yes; ComponentLink1Description: Datasheet; ComponentLink1URL: https://wmsc.lcsc.com/wmsc/upload/file/pdf/v2/lcsc/2106062140_Kyocera-AVX-08055G224ZAT2A_C2760773.pdf; ComponentLink2Description: JLCPCB Part URL; ComponentLink2URL: https://jlcpcb.com/partdetail/C2760773; ComponentLink3Description: LCSC Part URL; ComponentLink3URL: https://lcsc.com/product-detail/Multilayer-Ceramic-Capacitors-MLCC---SMD-SMT_Kyocera-AVX-Kyocera-AVX-08055G224ZAT2A_C2760773.html
footprint CAP-0805 (0805 (2012M) Capacitor)
pins: 1, 2

## 08056D106KAT2A
designator C?  Capacitance: 10uF  (hidden comment: *)
Capacitor, Ceramic (MLCC), 10uF, ±10%, 6.3V, X5R, ±10%, SMD 0805; Manufacturer: Kyocera AVX; Manufacturer Part Number: 08056D106KAT2A; Package Size: 0805; JLCPCB Basic Part: No; JLCPCB Part Number: C2167706; Supplier 1: LCSC; Category: Capacitors - MLCC; Supplier Part Number 1: C2167706; Tolerance: ±10%; Voltage Rating: 6.3V; Temperature Coefficient: X5R; RoHS: Yes; ComponentLink1Description: Datasheet; ComponentLink1URL: https://wmsc.lcsc.com/wmsc/upload/file/pdf/v2/lcsc/2304140030_Kyocera-AVX-08056D106KAT2A_C2167706.pdf; ComponentLink2Description: JLCPCB Part URL; ComponentLink2URL: https://jlcpcb.com/partdetail/C2167706; ComponentLink3Description: LCSC Part URL; ComponentLink3URL: https://lcsc.com/product-detail/Multilayer-Ceramic-Capacitors-MLCC---SMD-SMT_Kyocera-AVX-Kyocera-AVX-08056D106KAT2A_C2167706.html
footprint CAP-0805 (0805 (2012M) Capacitor)
pins: 1, 2

## 08056D226MAT2A
designator C?  Capacitance: 22uF  (hidden comment: *)
Capacitor, Ceramic (MLCC), 22uF, ±20%, 6.3V, ±20%, SMD 0805; Manufacturer: Kyocera AVX; Manufacturer Part Number: 08056D226MAT2A; Package Size: 0805; JLCPCB Basic Part: No; JLCPCB Part Number: C4944892; Supplier 1: LCSC; Category: Capacitors - MLCC; Supplier Part Number 1: C4944892; Tolerance: ±20%; Voltage Rating: 6.3V; RoHS: Yes; ComponentLink1Description: Datasheet; ComponentLink1URL: https://wmsc.lcsc.com/wmsc/upload/file/pdf/v2/lcsc/2302061909_Kyocera-AVX-08056D226MAT2A_C4944892.pdf; ComponentLink2Description: JLCPCB Part URL; ComponentLink2URL: https://jlcpcb.com/partdetail/C4944892; ComponentLink3Description: LCSC Part URL; ComponentLink3URL: https://lcsc.com/product-detail/Multilayer-Ceramic-Capacitors-MLCC---SMD-SMT_Kyocera-AVX-Kyocera-AVX-08056D226MAT2A_C4944892.html
footprint CAP-0805 (0805 (2012M) Capacitor)
pins: 1, 2

## 08056D475KAT2A
designator C?  Capacitance: 4.7uF  (hidden comment: *)
Capacitor, Ceramic (MLCC), 4.7uF, ±10%, 6.3V, X5R, ±10%, SMD 0805; Manufacturer: AVX; Manufacturer Part Number: 08056D475KAT2A; Package Size: 0805; JLCPCB Basic Part: No; JLCPCB Part Number: C597428; Supplier 1: LCSC; Category: Capacitors - MLCC; Supplier Part Number 1: C597428; Tolerance: ±10%; Voltage Rating: 6.3V; Temperature Coefficient: X5R; RoHS: Yes; ComponentLink1Description: Datasheet; ComponentLink1URL: https://wmsc.lcsc.com/wmsc/upload/file/pdf/v2/lcsc/2304140030_Kyocera-AVX-08056D475KAT2A_C597428.pdf; ComponentLink2Description: JLCPCB Part URL; ComponentLink2URL: https://jlcpcb.com/partdetail/C597428; ComponentLink3Description: LCSC Part URL; ComponentLink3URL: https://lcsc.com/product-detail/Multilayer-Ceramic-Capacitors-MLCC---SMD-SMT_Kyocera-AVX-Kyocera-AVX-08056D475KAT2A_C597428.html
footprint CAP-0805 (0805 (2012M) Capacitor)
pins: 1, 2

## 885012207051
designator C?  Capacitance: 1uF  (hidden comment: *)
Capacitor, Ceramic (MLCC), 1uF, ±10%, 16V, X7R, ±10%, SMD 0805; Manufacturer: Wurth Elektronik; Manufacturer Part Number: 885012207051; Package Size: 0805; JLCPCB Basic Part: No; JLCPCB Part Number: C2176371; Supplier 1: LCSC; Category: Capacitors - MLCC; Supplier Part Number 1: C2176371; Tolerance: ±10%; Voltage Rating: 16V; Temperature Coefficient: X7R; RoHS: Yes; ComponentLink1Description: Datasheet; ComponentLink1URL: https://wmsc.lcsc.com/wmsc/upload/file/pdf/v2/lcsc/2202040830_Wurth-Elektronik-885012207051_C2176371.pdf; ComponentLink2Description: JLCPCB Part URL; ComponentLink2URL: https://jlcpcb.com/partdetail/C2176371; ComponentLink3Description: LCSC Part URL; ComponentLink3URL: https://lcsc.com/product-detail/Multilayer-Ceramic-Capacitors-MLCC---SMD-SMT_Wurth-Elektronik-Wurth-Elektronik-885012207051_C2176371.html
footprint CAP-0805 (0805 (2012M) Capacitor)
pins: 1, 2

## AC0805JRNPO0BN100
designator C?  Capacitance: 10pF  (hidden comment: *)
Capacitor, Ceramic (MLCC), 10pF, ±5%, 100V, NP0, ±5%, SMD 0805; Manufacturer: YAGEO; Manufacturer Part Number: AC0805JRNPO0BN100; Package Size: 0805; JLCPCB Basic Part: No; JLCPCB Part Number: C2897303; Supplier 1: LCSC; Category: Capacitors - MLCC; Supplier Part Number 1: C2897303; Tolerance: ±5%; Voltage Rating: 100V; Temperature Coefficient: NP0; RoHS: Yes; ComponentLink1Description: Datasheet; ComponentLink1URL: https://wmsc.lcsc.com/wmsc/upload/file/pdf/v2/lcsc/2203081130_YAGEO-AC0805JRNPO0BN100_C2897303.pdf; ComponentLink2Description: JLCPCB Part URL; ComponentLink2URL: https://jlcpcb.com/partdetail/C2897303; ComponentLink3Description: LCSC Part URL; ComponentLink3URL: https://lcsc.com/product-detail/Multilayer-Ceramic-Capacitors-MLCC---SMD-SMT_YAGEO-YAGEO-AC0805JRNPO0BN100_C2897303.html
footprint CAP-0805 (0805 (2012M) Capacitor)
pins: 1, 2